# Altium footprint library PCBKU.PcbLib: 190 footprints (part 6 of 12)
Each footprint in its own frame and in the unit in brackets; x right, y up, seen from the top. Pads: shape width x height; smd on the part's side, far side on the other; paste and mask are expansions set on the pad; w line width, h text height; cw(c..) or ccw(c..) is an arc to the next point about the centre after c.
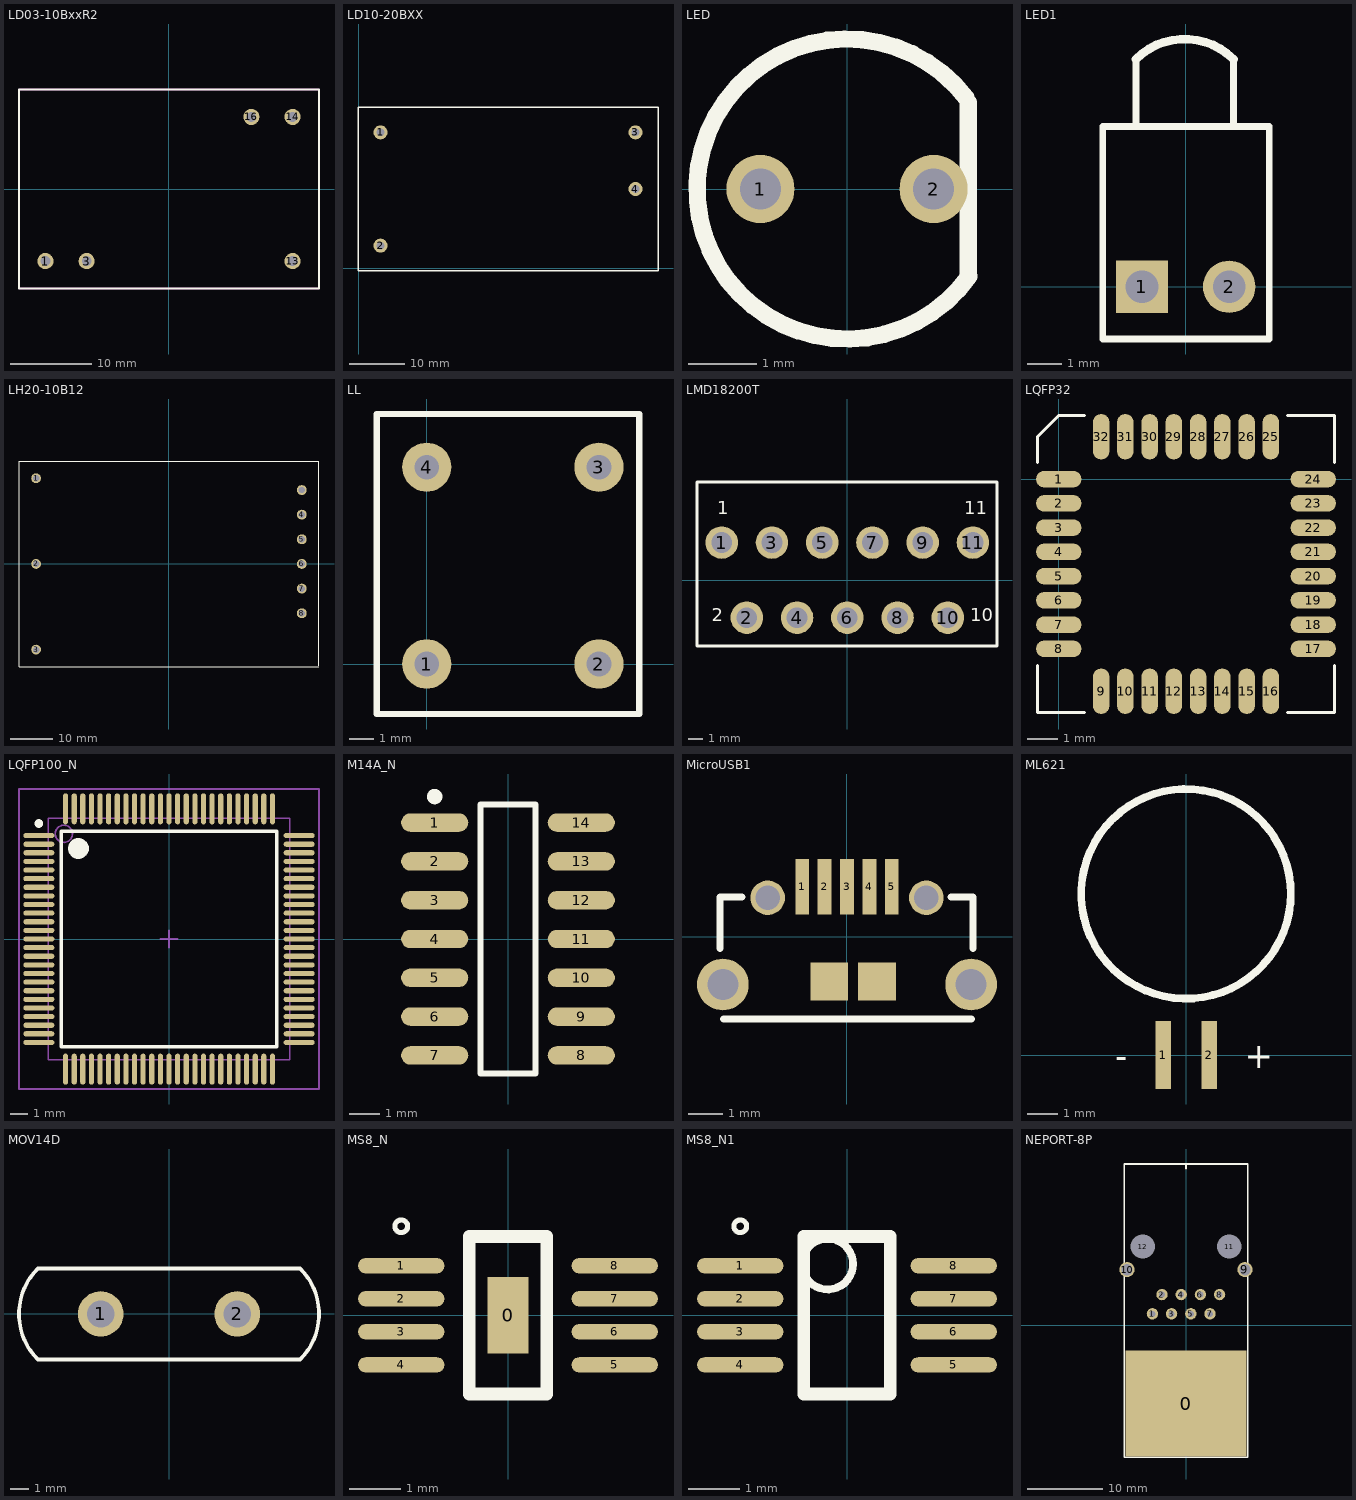
[diagram p5: the footprints below, top view; thin cyan lines are the x and y axes]

## LD03-10BxxR2 [mm]
pads (5):
  round 2 hole 1.2: 1(-15.24,-8.89) 3(-10.16,-8.89) 13(15.24,-8.89) 14(15.24,8.89) 16(10.16,8.89)
Top Overlay:
  lines w0.254: -18.5,-12.25 -18.5,12.25 18.5,12.25 18.5,-12.25 -18.5,-12.25
Keep-Out Layer:
  lines w0.254: -18.5,-12.25 18.5,-12.25 18.5,12.25 -18.5,12.25 -18.5,-12.25

## LD10-20BXX [mil]
height 43.31
pads (4):
  round 100 hole 55: 1(153,961) 2(153,161) 3(1953,961) 4(1953,561)
Top Overlay:
  lines w9.84: -5.91,-15.75 2112.2,-15.75 2112.2,1137.8 -5.91,1137.8 -5.91,-15.75

## LED [mm]
pads (2):
  round 1 hole 0.6: 1(-1.27,0) 2(1.27,0)
Top Overlay:
  lines w0.254: 1.744,1.341 ccw(c0,0) 1.79,-1.279 ; 1.778,-1.27 1.778,1.27

## LED1 [mil]
pads (2):
  rect 60x60 hole 37.4: 1(-50,0)
  round 60 hole 37.4: 2(50,0)
Top Overlay:
  lines w8: -57,183.91 -57,261 ; 55,183.91 55,261 ; -95,-60 96,-60 96,184 -95,184 -95,-60
  lines w10: -57,261 cw(c-1,205) 55,261

## LH20-10B12 [mm]
height 1.1
pads (9):
  round 2.3 hole 1.5: 1(-31,20) 2(-31,0) 3(-31,-20) 4(31,11.5) 5(31,5.75) 6(31,0) 7(31,-5.75) 8(31,-11.5) Trim(31,17.25)
Top Overlay:
  lines w0.254: -35,-24.012 -35,23.988 ; -35,23.992 35.002,23.992 35.002,-23.79 ; -34.962,-24.018 35.015,-24.018
3D body: height 23.5, standoff -6, extent -35.103,-24.028 34.897,23.972

## LL [mm]
height 1.1
pads (4):
  round 2 hole 1: 1(0,0) 2(7,0) 3(7,8) 4(0,8)
Top Overlay:
  lines w0.254: -2.032,-2.032 -2.032,10.16 -1.524,10.16 8.636,10.16 8.636,-2.032 -2.032,-2.032

## LMD18200T [mm]
pads (11):
  round 2.2 hole 1.4: 1(-8.5,2.54) 2(-6.8,-2.54) 3(-5.1,2.54) 4(-3.4,-2.54) 5(-1.7,2.54) 6(0,-2.54) 7(1.7,2.54) 8(3.4,-2.54) 9(5.1,2.54) 10(6.8,-2.54) 11(8.5,2.54)
Top Overlay:
  lines w0.203: -10.173,-4.47 10.127,-4.47 10.127,6.65 -10.173,6.65 -10.173,-4.47
  text "1" at -8.814,4.14 h1.52
  text "2" at -9.169,-3.073 h1.52
  text "11" at 7.899,4.14 h1.52
  text "10" at 8.331,-3.073 h1.52

## LQFP32 [mm]
pads (32):
  oval 1.5x0.55 smd: 1(0,0) 2(0,-0.8) 3(0,-1.6) 4(0,-2.4) 5(0,-3.2) 6(0,-4) 7(0,-4.8) 8(0,-5.6) 17(8.4,-5.6) 18(8.4,-4.8) 19(8.4,-4) 20(8.4,-3.2) 21(8.4,-2.4) 22(8.4,-1.6) 23(8.4,-0.8) 24(8.4,0)
  oval 0.55x1.5 smd: 9(1.4,-7) 10(2.2,-7) 11(3,-7) 12(3.8,-7) 13(4.6,-7) 14(5.4,-7) 15(6.2,-7) 16(7,-7) 25(7,1.4) 26(6.2,1.4) 27(5.4,1.4) 28(4.6,1.4) 29(3.8,1.4) 30(3,1.4) 31(2.2,1.4) 32(1.4,1.4)
Top Overlay:
  lines w0.1: -0.7,-6.15 -0.7,-7.7 0.85,-7.7 ; -0.7,0.55 -0.7,1.4 0,2.1 0.85,2.1 ; 7.55,-7.7 9.1,-7.7 9.1,-6.15 ; 7.55,2.1 9.1,2.1 9.1,0.55
3D body: height 1.63, standoff -0.09, extent -0.309,-7.341 8.691,1.659

## LQFP100_N [mm]
pads (100):
  oval 1.8x0.3 smd: 1(-7.55,6) 2(-7.55,5.5) 3(-7.55,5) 4(-7.55,4.5) 5(-7.55,4) 6(-7.55,3.5) 7(-7.55,3) 8(-7.55,2.5) 9(-7.55,2) 10(-7.55,1.5) 11(-7.55,1) 12(-7.55,0.5) 14(-7.55,-0.5) 15(-7.55,-1) 16(-7.55,-1.5) 17(-7.55,-2) 18(-7.55,-2.5) 19(-7.55,-3) 20(-7.55,-3.5) 21(-7.55,-4) 22(-7.55,-4.5) 23(-7.55,-5) 24(-7.55,-5.5) 25(-7.55,-6) 51(7.55,-6) 52(7.55,-5.5) 53(7.55,-5) 54(7.55,-4.5) 55(7.55,-4) 56(7.55,-3.5) 57(7.55,-3) 58(7.55,-2.5) 59(7.55,-2) 60(7.55,-1.5) 61(7.55,-1) 62(7.55,-0.5) 63(7.55,0) 64(7.55,0.5) 65(7.55,1) 66(7.55,1.5) 67(7.55,2) 68(7.55,2.5) 69(7.55,3) 70(7.55,3.5) 71(7.55,4) 72(7.55,4.5) 73(7.55,5) 74(7.55,5.5) 75(7.55,6)
  oval 1.8x0.275 smd: 13(-7.55,0)
  oval 0.3x1.8 smd: 26(-6,-7.55) 27(-5.5,-7.55) 28(-5,-7.55) 29(-4.5,-7.55) 30(-4,-7.55) 31(-3.5,-7.55) 32(-3,-7.55) 33(-2.5,-7.55) 34(-2,-7.55) 35(-1.5,-7.55) 36(-1,-7.55) 37(-0.5,-7.55) 38(0,-7.55) 39(0.5,-7.55) 40(1,-7.55) 41(1.5,-7.55) 42(2,-7.55) 43(2.5,-7.55) 44(3,-7.55) 45(3.5,-7.55) 46(4,-7.55) 47(4.5,-7.55) 48(5,-7.55) 49(5.5,-7.55) 50(6,-7.55) 76(6,7.55) 77(5.5,7.55) 78(5,7.55) 79(4.5,7.55) 80(4,7.55) 81(3.5,7.55) 82(3,7.55) 83(2.5,7.55) 84(2,7.55) 85(1.5,7.55) 86(1,7.55) 87(0.5,7.55) 88(0,7.55) 89(-0.5,7.55) 90(-1,7.55) 91(-1.5,7.55) 92(-2,7.55) 93(-2.5,7.55) 94(-3,7.55) 95(-3.5,7.55) 96(-4,7.55) 97(-4.5,7.55) 98(-5,7.55) 99(-5.5,7.55) 100(-6,7.55)
Top Overlay:
  circle w0.6: c-5.25,5.25 r0.3
  circle w0.25: c-7.55,6.7 r0.125
  lines w0.2: -6.25,-6.25 6.25,-6.25 6.25,6.25 -6.25,6.25 -6.25,-6.25
Mechanical 13:
  circle w0.1: c-6.1,6.1 r0.5
  lines w0.1: -7,-7 7,-7 7,7 -7,7 -7,-7
Mechanical 15:
  lines w0.1: -0.5,0 0.5,0 ; 0,-0.5 0,0.5 ; -8.7,-8.7 8.7,-8.7 8.7,8.7 -8.7,8.7 -8.7,-8.7

## M14A_N [mm]
pads (14):
  oval 2.2x0.6 smd: 1(-2.4,3.81) 2(-2.4,2.54) 3(-2.4,1.27) 4(-2.4,0) 5(-2.4,-1.27) 6(-2.4,-2.54) 7(-2.4,-3.81) 8(2.4,-3.81) 9(2.4,-2.54) 10(2.4,-1.27) 11(2.4,0) 12(2.4,1.27) 13(2.4,2.54) 14(2.4,3.81)
Top Overlay:
  circle w0.25: c-2.4,4.66 r0.125
  lines w0.2: -0.9,-4.4 0.9,-4.4 0.9,4.4 -0.9,4.4 -0.9,-4.4

## MicroUSB1 [mm]
pads (11):
  rect 0.4x1.6 smd: 1(-1.3,1.454) 2(-0.65,1.454) 3(0,1.454) 4(0.65,1.454) 5(1.3,1.454)
  round 1.5 hole 0.9: ""(-3.6,-1.378) ""(3.6,-1.378)
  round 1 hole 0.7: ""(-2.3,1.137) ""(2.3,1.137)
  rect 1.1x1.1 smd: ""(-0.514,-1.289) ""(0.87,-1.289)
Top Overlay:
  lines w0.203: -3.683,-0.33 -3.683,1.156 -3.048,1.156 ; -3.581,-2.375 3.607,-2.375 ; 3.023,1.156 3.658,1.156 3.658,-0.33

## ML621 [mm]
pads (2):
  rect 0.5x2.2 smd: 1(-0.75,0) 2(0.75,0)
Top Overlay:
  circle w0.254: c-0.01,5.232 r3.4
  text "-" at -2.299,-0.432 h0.8
  text "+" at 1.892,-0.432 h0.8

## MOV14D [mm]
pads (2):
  round 2.5 hole 1.5: 1(-3.75,0) 2(3.75,0)
Top Overlay:
  lines w0.203: -7.204,-2.504 cw(c-4.702,-0.002) -7.204,2.5 7.204,2.5 cw(c4.702,-0.002) 7.204,-2.504 -7.204,-2.504

## MS8_N [mm]
height 1.1
pads (9):
  rect 0.8x1.5 smd: 0(0,0)
  oval 1.7x0.3 smd: 1(-2.1,0.975) 2(-2.1,0.325) 3(-2.1,-0.325) 4(-2.1,-0.975) 5(2.1,-0.975) 6(2.1,-0.325) 7(2.1,0.325) 8(2.1,0.975)
Top Overlay:
  circle w0.1: c-2.1,1.75 r0.125
  lines w0.25: 0.762,-1.55 -0.762,-1.55 -0.762,1.55 0.762,1.55
  lines w0.254: 0.762,-1.55 0.762,1.55

## MS8_N1 [mm]
height 1.1
pads (8):
  oval 1.7x0.3 smd: 1(-2.1,0.975) 2(-2.1,0.325) 3(-2.1,-0.325) 4(-2.1,-0.975) 5(2.1,-0.975) 6(2.1,-0.325) 7(2.1,0.325) 8(2.1,0.975)
Top Overlay:
  circle w0.1: c-2.1,1.75 r0.125
  circle w0.152: c-0.381,1.008 r0.5
  lines w0.25: -0.85,-1.55 0.85,-1.55 0.85,1.55 -0.85,1.55 -0.85,-1.55

## NEPORT-8P [mm]
pads (13):
  rect 16x14 smd: 0(0.025,-10.378)
  round 1.5 hole 0.8: 1(-4.445,1.488) 2(-3.175,4.028) 3(-1.905,1.488) 4(-0.635,4.028) 5(0.635,1.488) 6(1.905,4.028) 7(3.175,1.488) 8(4.445,4.028)
  round 2 hole 1.5: 9(7.795,7.327) 10(-7.795,7.327)
  round 1.524 hole 3.2: 11(5.715,10.378) 12(-5.715,10.378)
Top Overlay:
  lines w0.203: -8.15,-17.503 8.15,-17.503 8.15,21.297 -8.15,21.297 -8.15,-17.503
  lines w0.254: 0,20.697 0,21.297